# Altium footprint library mylib.PcbLib: 82 footprints (part 1 of 6)
Each footprint in its own frame and in the unit in brackets; x right, y up, seen from the top. Pads: shape width x height; smd on the part's side, far side on the other; paste and mask are expansions set on the pad; w line width, h text height; cw(c..) or ccw(c..) is an arc to the next point about the centre after c.
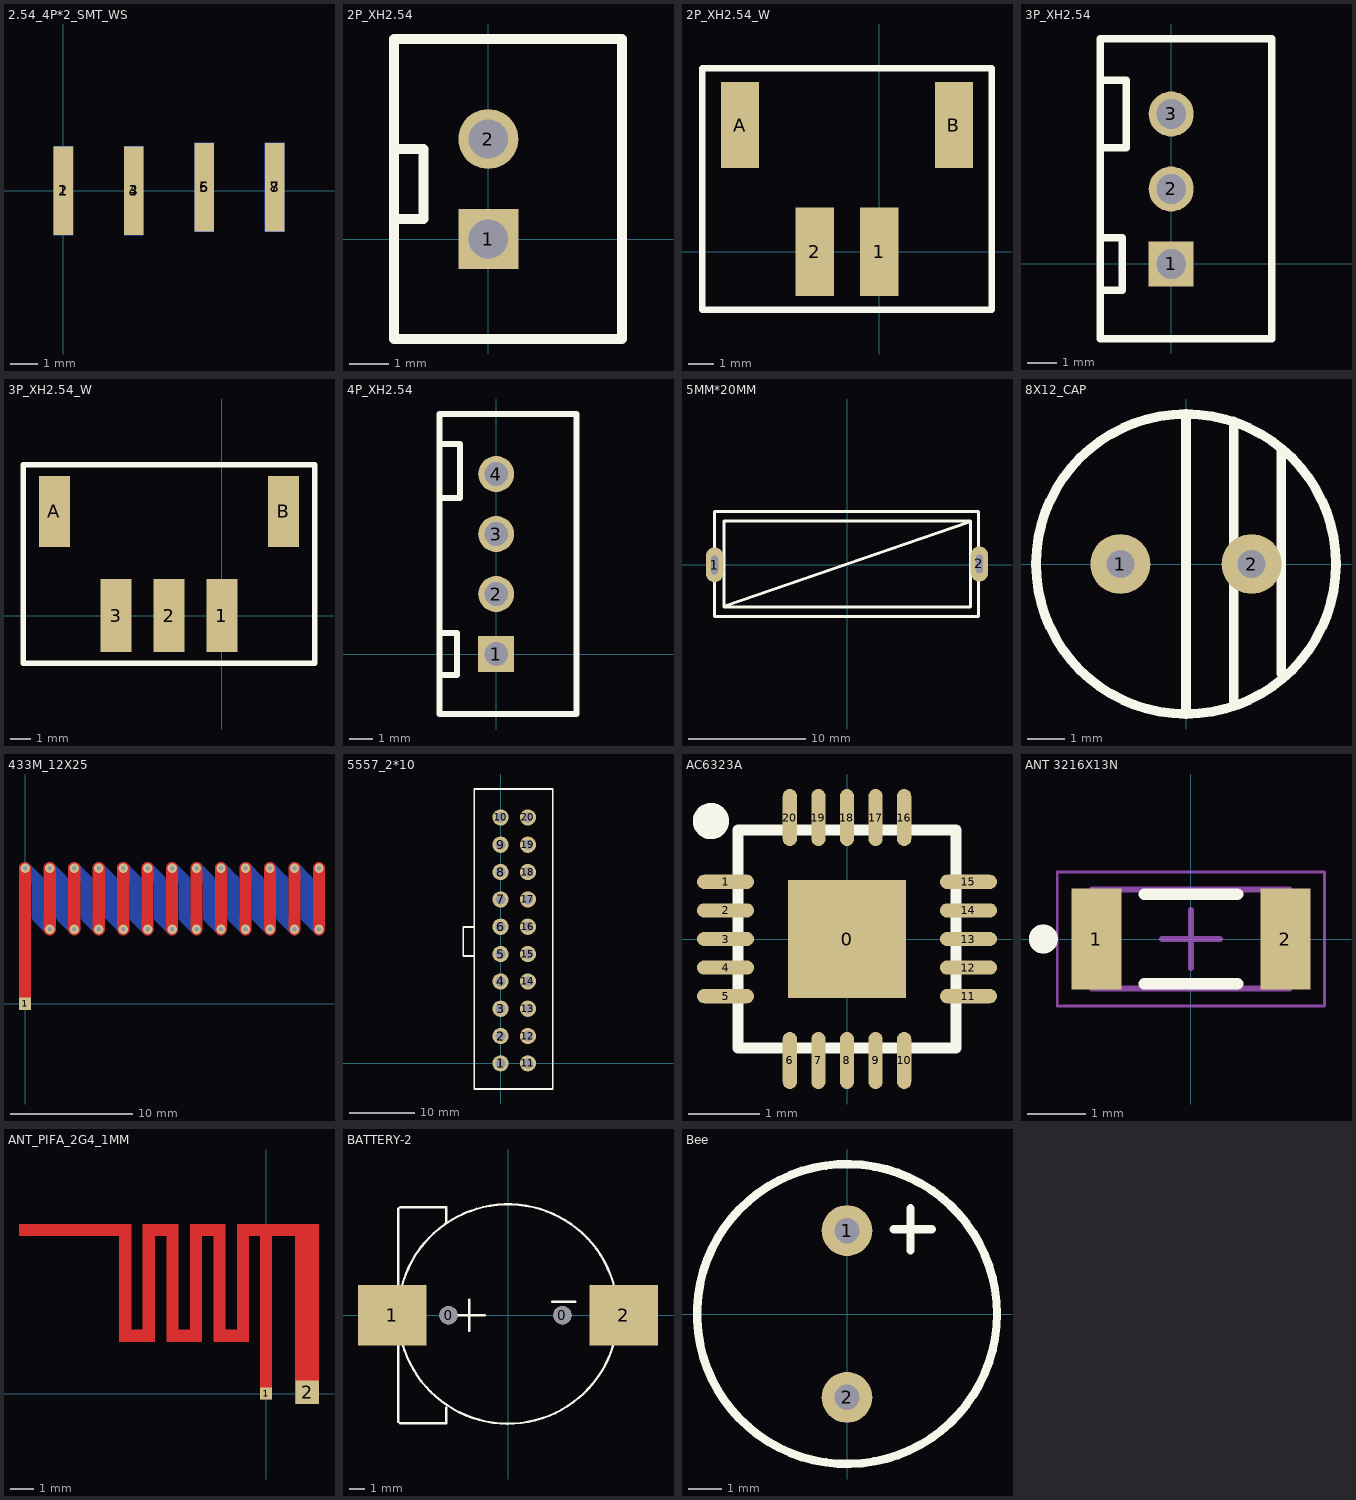
[diagram p0: the footprints below, top view; thin cyan lines are the x and y axes]

## 2.54_2P*2_SMT_WS [mm]

## 2.54_4P*2_SMT_WS [mm]
pads (8):
  rect 0.7x3.2 smd: 1(0,0) 3(2.54,0) 5(5.08,0.127) 7(7.62,0.127)
  rect 0.7x3.2 smd far side: 2(0,0) 4(2.54,0) 6(5.08,0.127) 8(7.62,0.127)

## 2P_XH2.54 [mil]
pads (2):
  rect 60x60 hole 39.37: 1(0,0)
  round 60 hole 39.37: 2(0,100)
Top Overlay:
  lines w10: -94.49,20 -65,20 -65,90 -94.49,90 ; -94.49,-100 -94.49,200 133.86,200 133.86,-100 -94.49,-100

## 2P_XH2.54_W [mm]
pads (4):
  rect 1.524x3.5 smd: 1(0,0) 2(-2.54,0)
  rect 1.5x3.4 smd: A(-5.49,5) B(2.95,5)
Top Overlay:
  lines w0.254: -6.985,-2.286 -6.985,7.239 4.445,7.239 4.445,-2.286 -6.985,-2.286

## 3P_XH2.54 [mil]
pads (3):
  rect 60x60 hole 39.37: 1(0,0)
  round 60 hole 39.37: 2(0,100) 3(0,200)
Top Overlay:
  lines w10: -94.49,-35 -65,-35 -65,35 -94.49,35 ; -94.49,155 -60,155 -60,245 -94.49,245 ; -94.49,-100 133.86,-100 133.86,300 -94.49,300 -94.49,-100

## 3P_XH2.54_W [mm]
pads (5):
  rect 1.5x3.5 smd: 1(0,0) 2(-2.54,0) 3(-5.08,0)
  rect 1.5x3.4 smd: A(-8.03,5) B(2.95,5)
Top Overlay:
  lines w0.254: -9.525,-2.286 4.445,-2.286 4.445,7.239 -9.525,7.239 -9.525,-2.286

## 4P_XH2.54 [mil]
pads (4):
  rect 60x60 hole 39.37: 1(0,0)
  round 60 hole 39.37: 2(0,100) 3(0,200) 4(0,300)
Top Overlay:
  lines w10: -94.49,-35 -65,-35 -65,35 -94.49,35 ; -94.49,260 -60,260 -60,350 -94.49,350 ; -94.49,-100 133.86,-100 133.86,400 -94.49,400 -94.49,-100

## 5MM*20MM [mm]
pads (2):
  oval 1.5x3 hole 0.6 slot 1.6 at 90 deg copper offset 0.001,0.03: 1(-11.356,-0.05)
  oval 1.5x3 hole 0.6 slot 1.6 at 90 deg copper offset -0.001,0: 2(11.326,0.052)
Top Overlay:
  lines w0.254: -10.456,-3.549 10.444,3.651 ; -11.356,-4.449 11.244,-4.449 11.244,4.551 -11.356,4.551 -11.356,2.99 -11.356,-4.449 ; -10.556,-3.649 -10.556,3.751 10.544,3.751 10.544,-3.649 -10.556,-3.649

## 8X12_CAP [mm]
pads (2):
  round 1.6 hole 0.75: 1(-1.75,0) 2(1.75,0)
Top Overlay:
  circle w0.254: c0,0 r4
  lines w0.254: 0,-3.937 0,3.937 ; 1.27,-3.683 1.27,3.81 ; 2.54,-2.921 2.54,3.048

## 433M_12X25 [mm]
height 1
pads (1):
  rect 1x1 smd paste-2: 1(0,0)
via 24.008,11.082 diameter 0.76 hole 0.381
via 0.008,11.082 diameter 0.76 hole 0.381
via 2.009,6.083 diameter 0.76 hole 0.381
via 2.009,11.082 diameter 0.76 hole 0.381
via 4.008,6.083 diameter 0.76 hole 0.381
via 4.008,11.082 diameter 0.76 hole 0.381
via 6.01,11.082 diameter 0.76 hole 0.381
via 8.009,11.082 diameter 0.76 hole 0.381
via 8.009,6.083 diameter 0.76 hole 0.381
via 10.008,6.083 diameter 0.76 hole 0.381
via 10.008,11.082 diameter 0.76 hole 0.381
via 12.009,11.082 diameter 0.76 hole 0.381
via 12.009,6.083 diameter 0.76 hole 0.381
via 14.008,6.083 diameter 0.76 hole 0.381
via 14.008,11.082 diameter 0.76 hole 0.381
via 16.007,11.082 diameter 0.76 hole 0.381
via 16.007,6.083 diameter 0.76 hole 0.381
via 18.009,11.082 diameter 0.76 hole 0.381
via 18.009,6.083 diameter 0.76 hole 0.381
via 20.008,6.083 diameter 0.76 hole 0.381
via 20.008,11.082 diameter 0.76 hole 0.381
via 22.009,11.082 diameter 0.76 hole 0.381
via 22.009,6.083 diameter 0.76 hole 0.381
via 24.008,6.083 diameter 0.76 hole 0.381
via 6.007,6.083 diameter 0.76 hole 0.381
Top Layer:
  lines w0.254: 0,11.074 0.008,11.082
  lines w1: 0,0 0,11.074 ; 2.009,6.083 2.009,11.082 ; 4.008,6.083 4.008,11.082 ; 6.007,6.083 6.01,6.083 6.01,10.373 6.01,11.082 ; 8.009,6.083 8.009,11.082 ; 10.008,6.083 10.008,11.082 ; 12.009,6.083 12.009,11.082 ; 14.008,6.083 14.008,11.082 ; 16.007,6.083 16.007,11.082 ; 18.009,6.083 18.009,11.082 ; 20.008,6.083 20.008,11.082 ; 22.009,6.083 22.009,11.082 ; 24.008,6.083 24.008,11.082
Bottom Layer:
  lines w0.254: 1.875,6.083 2.009,6.083 ; 2.009,11.082 2.149,11.082 ; 3.919,6.083 4.008,6.083 ; 6.007,6.083 6.007,6.129 ; 8.009,6.083 8.009,6.19
  lines w1: 0.008,11.082 1.008,10.081 ; 1.013,7.122 2.004,6.129 ; 1.016,7.122 1.016,10.081 ; 2.009,11.082 3.01,10.081 ; 3.015,7.122 4.006,6.129 ; 3.018,7.122 3.018,10.081 ; 4.008,11.082 5.009,10.081 5.016,10.081 5.016,7.122 6.007,6.129 ; 6.01,11.082 6.993,10.099 6.993,7.206 8.009,6.19 ; 8.009,11.082 9.022,10.069 9.022,7.069 10.008,6.083 ; 10.008,11.082 11.016,10.074 11.016,7.074 12.009,6.083 ; 12.009,11.082 13.018,10.071 13.018,7.071 14.008,6.083 ; 14.008,11.082 15.022,10.069 15.022,7.069 16.007,6.083 ; 16.007,11.082 17.008,10.084 17.008,7.082 18.009,6.083 ; 18.009,11.082 18.997,10.091 18.997,7.092 20.008,6.083 ; 20.008,11.082 21.011,10.081 21.011,7.079 22.009,6.083 ; 22.009,11.082 23.01,10.081 23.01,7.082 24.008,6.083

## 5557_2*10 [mm]
pads (20):
  round 2.5 hole 1.5: 1(0,0) 2(0,4.2) 3(0,8.4) 4(0,12.6) 5(0,16.8) 6(0,21) 7(0,25.2) 8(0,29.4) 9(0,33.6) 10(0,37.8) 11(4.2,0) 12(4.2,4.2) 13(4.2,8.4) 14(4.2,12.6) 15(4.2,16.8) 16(4.2,21) 17(4.2,25.2) 18(4.2,29.4) 19(4.2,33.6) 20(4.2,37.8)
Top Overlay:
  lines w0.254: -4.191,16.51 -5.715,16.51 -5.715,20.955 -4.064,20.955 ; -4.064,-3.937 8.001,-3.937 8.001,42.164 -4.064,42.164 -4.064,-3.937

## AC6323A [mm] "QFN 20 3*3"
pads (21):
  rect 1.65x1.65 smd: 0(0,0)
  oval 0.8x0.2 smd: 1(-1.7,0.8) 2(-1.7,0.4) 3(-1.7,0) 4(-1.7,-0.4) 5(-1.7,-0.8) 11(1.7,-0.8) 12(1.7,-0.4) 13(1.7,0) 14(1.7,0.4) 15(1.7,0.8)
  oval 0.2x0.8 smd: 6(-0.8,-1.7) 7(-0.4,-1.7) 8(0,-1.7) 9(0.4,-1.7) 10(0.8,-1.7) 16(0.8,1.7) 17(0.4,1.7) 18(0,1.7) 19(-0.4,1.7) 20(-0.8,1.7)
Top Overlay:
  circle w0.254: c-1.905,1.651 r0.127
  lines w0.152: -1.524,-1.524 0,-1.524 1.524,-1.524 1.524,1.524 -1.524,1.524 -1.524,-1.524
3D body: height 0.75, standoff 0.02, extent -1.524,-1.524 1.524,1.524

## ANT 3216X13N [mm] "Chip Inductor, 2-Leads, Body 3.20x1.60mm, IPC Medium Density"
height 1.3
pads (2):
  rect 0.86x1.74 smd: 1(-1.625,0) 2(1.625,0)
Top Overlay:
  circle w0.25: c-2.54,0 r0.125
  lines w0.2: -0.8,-0.77 0.8,-0.77 ; -0.8,0.77 0.8,0.77
Mechanical 13:
  lines w0.1: -1.7,-0.85 -1.7,0.85 1.7,0.85 1.7,-0.85 -1.7,-0.85
Mechanical 15:
  lines w0.05: -2.3,-1.15 -2.3,1.15 2.3,1.15 2.3,-1.15 -2.3,-1.15
  lines w0.1: -0.5,0 0.5,0 ; 0,-0.5 0,0.5
3D body: height 1.3, standoff 0, extent -1.45,-0.85 1.45,0.85
3D body: height 1.3, standoff 0, extent -1.7,-0.85 -1.45,0.85
3D body: height 1.3, standoff 0, extent 1.45,-0.85 1.7,0.85

## ANT_PIFA_2G4_1MM [mm]
pads (2):
  rect 0.5x0.5 smd: 1(0,0)
  rect 1x1 smd: 2(1.75,0.06)
Top Layer:
  region: 0.25,6.95 -0.25,6.95 -0.25,-0.25 0.25,-0.25
  region: 2.25,7.2 -1.23,7.2 -1.23,6.7 2.25,6.7
  region: -0.73,7.2 -1.23,7.2 -1.23,2.2 -0.73,2.2
  region: -0.73,2.7 -2.23,2.7 -2.23,2.2 -0.73,2.2
  region: -1.73,7.2 -2.23,7.2 -2.23,2.2 -1.73,2.2
  region: -1.73,7.2 -3.23,7.2 -3.23,6.7 -1.73,6.7
  region: -2.73,7.2 -3.23,7.2 -3.23,2.2 -2.73,2.2
  region: -2.73,2.7 -4.23,2.7 -4.23,2.2 -2.73,2.2
  region: -3.73,7.2 -4.23,7.2 -4.23,2.2 -3.73,2.2
  region: -3.73,7.2 -5.23,7.2 -5.23,6.7 -3.73,6.7
  region: -4.73,7.2 -5.23,7.2 -5.23,2.2 -4.73,2.2
  region: -4.73,2.7 -6.23,2.7 -6.23,2.2 -4.73,2.2
  region: -5.73,7.2 -6.23,7.2 -6.23,2.2 -5.73,2.2
  region: 2.25,6.95 1.25,6.95 1.25,-0.441 2.25,-0.441
  region: -5.73,7.2 -10.5,7.2 -10.5,6.7 -5.73,6.7
Top Solder:
  region: 2.25,6.95 1.25,6.95 1.25,0.6 2.25,0.6
  region: -5.73,7.2 -10.5,7.2 -10.5,6.7 -5.73,6.7
  region: -4.73,2.7 -6.23,2.7 -6.23,2.2 -4.73,2.2
  region: -4.73,7.2 -5.23,7.2 -5.23,2.2 -4.73,2.2
  region: -3.73,7.2 -5.23,7.2 -5.23,6.7 -3.73,6.7
  region: -1.73,7.2 -3.23,7.2 -3.23,6.7 -1.73,6.7
  region: 2.25,7.2 -1.23,7.2 -1.23,6.7 2.25,6.7
  region: 0.25,6.95 -0.25,6.95 -0.25,0.346 0.25,0.346
  region: -5.73,7.2 -6.23,7.2 -6.23,2.2 -5.73,2.2
  region: -3.73,7.2 -4.23,7.2 -4.23,2.2 -3.73,2.2
  region: -2.73,7.2 -3.23,7.2 -3.23,2.2 -2.73,2.2
  region: -1.73,7.2 -2.23,7.2 -2.23,2.2 -1.73,2.2
  region: -0.73,7.2 -1.23,7.2 -1.23,2.2 -0.73,2.2
  region: -2.73,2.7 -4.23,2.7 -4.23,2.2 -2.73,2.2
  region: -0.73,2.7 -2.23,2.7 -2.23,2.2 -0.73,2.2

## BATTERY-2 [mm]
pads (4):
  round 1.2 hole 1.2: 0(-3.912,0) 0(3.581,0)
  rect 4.5x4 smd: 1(-7.62,0) 2(7.62,0)
Top Overlay:
  lines w0.152: -4.064,-6.096 -4.064,-7.112 -7.112,-7.112 -7.22,-7.004 -7.22,0 -7.22,7.004 -7.112,7.112 -4.064,7.112 -4.064,6.096 ; -3.556,0 -1.524,0 ; -2.54,-1.016 -2.54,1.016 ; 2.909,0.889 4.433,0.889 ; 7.219,-0.127 cw(c0.002,0.081) 7.221,0

## Bee [mil]
pads (2):
  round 60 hole 30: 1(0,98.43) 2(0,-98.43)
Top Overlay:
  circle w10: c0,0 r177.17
  lines w10: 55,100 100,100 ; 75,75 75,125